# Altium footprint library mobinbyn-Capacitor.PcbLib: 152 footprints (part 7 of 10)
Each footprint in its own frame and in the unit in brackets; x right, y up, seen from the top. Pads: shape width x height; smd on the part's side, far side on the other; paste and mask are expansions set on the pad; w line width, h text height; cw(c..) or ccw(c..) is an arc to the next point about the centre after c.
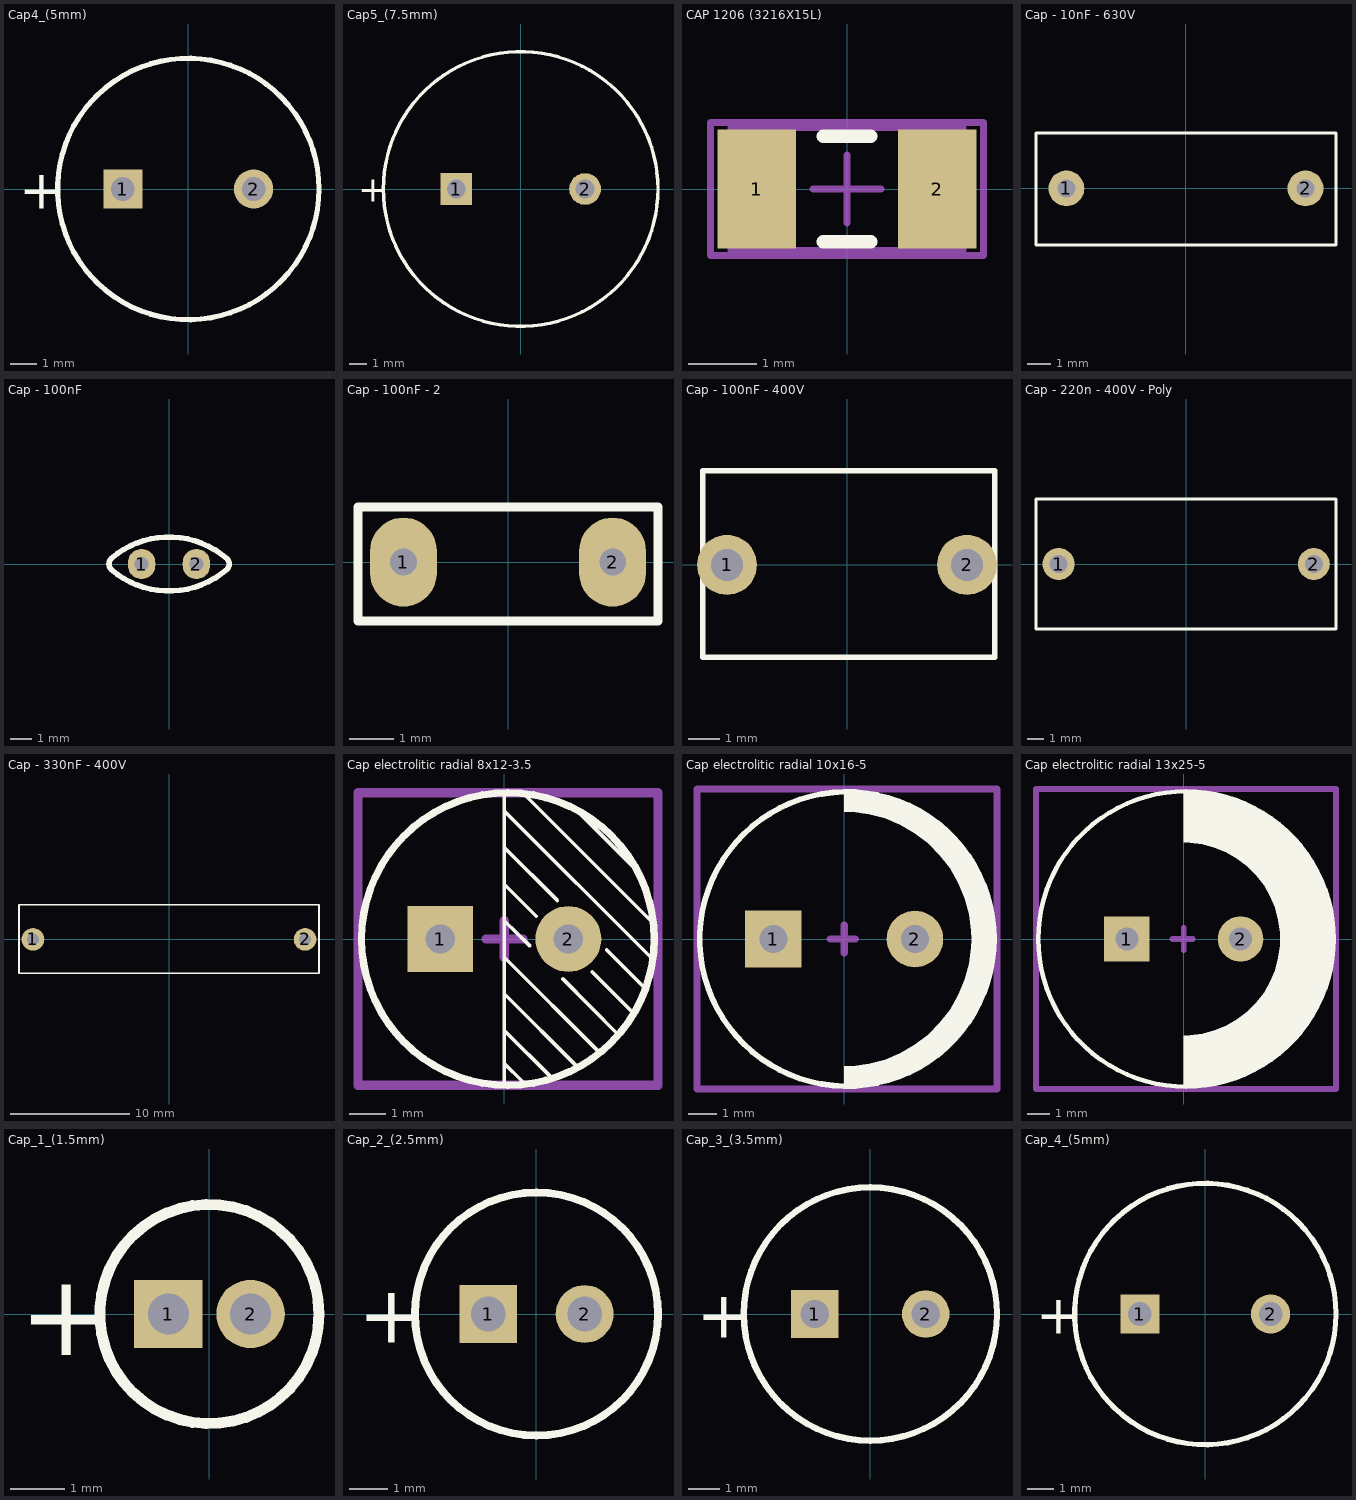
[diagram p6: the footprints below, top view; thin cyan lines are the x and y axes]

## Cap4_(5mm) [mm] "Capacitor, Electrolytic, Radial; Body 10 x 5 mm (Dia.xH typ); Pin Spacing 5 mm (typ)"
height 6
pads (2):
  rect 1.5x1.5 hole 0.9: 1(-2.5,0)
  round 1.5 hole 0.9: 2(2.5,0)
Top Overlay:
  circle w0.2: c0,0 r5
  text "+" at -6.475,-0.75 h1.5
3D body "User Library-Cap-EL(10x12-5)T.STEP": height 12.5, standoff -3.5, extent -5,-4.997 5.002,4.998

## Cap5_(7.5mm) [mm] "Capacitor, Electrolytic, Radial; Body 16 x 25 mm (Dia.xH typ); Pin Spacing 7.5 mm (typ)"
height 26
pads (2):
  rect 1.85x1.85 hole 1.1: 1(-3.75,0)
  round 1.85 hole 1.1: 2(3.75,0)
Top Overlay:
  circle w0.2: c0,0 r8
  text "+" at -9.475,-0.75 h1.5
3D body "User Library-Cap-EL(16x31_5-7_5)T.STEP": height 41, standoff -3, extent -8,-8 8.002,8

## CAP 1206 (3216X15L) [mm] "Chip Capacitor, 2-Leads, Body 3.2x1.6mm, IPC High Density"
height 1.52
pads (2):
  rect 1.15x1.75 smd: 1(-1.325,0) 2(1.325,0)
Top Overlay:
  lines w0.2: -0.35,-0.775 0.35,-0.775 ; -0.35,0.775 0.35,0.775
Mechanical 13:
  lines w0.1: -1.7,-0.9 -1.7,0.9 1.7,0.9 1.7,-0.9 -1.7,-0.9
Mechanical 15:
  lines w0.1: -0.5,0 0.5,0 ; 0,-0.5 0,0.5 ; -2,-0.975 -2,0.975 2,0.975 2,-0.975 -2,-0.975
3D body "1206 cap.STEP": height 1, standoff 0, extent -1.6,-0.8 1.6,0.8

## Cap - 10nF - 630V [mil]
pads (2):
  round 60 hole 30: 1(-200,0) 2(200,0)
Top Overlay:
  lines w5: -250.97,-94.52 251,-94.52 251,92.52 -250.97,92.52 -250.97,-94.52
3D body "Cap 10n - 630V Poly_2009.STEP": height 480, standoff -68.11, extent -250.97,-94.52 251,92.52

## Cap - 100nF [mil]
pads (2):
  oval 50x55 hole 25: 1(-50,0) 2(50,0)
Top Overlay:
  lines w10: -105.81,-9.79 ccw(c0,112.17) 106.05,-9.58 ; -105.81,9.79 cw(c0,-112.17) 106.05,9.58 ; -105.58,-9.52 cw(c-96.06,0) -105.58,9.52 ; 106,-9.52 ccw(c96.48,0) 106,9.52
3D body "Cap 100n.STEP": height 272.48, standoff -39.37, extent -115.06,-34 114.93,32.79

## Cap - 100nF - 2 [mm]
height 5
pads (2):
  oval 1.5x2 hole 0.6: 1(-2.35,0) 2(2.35,0)
Top Overlay:
  lines w0.2: -3.371,-1.328 -3.371,1.242 3.37,1.242 3.37,-1.328 -3.371,-1.328
3D body "cap.STEP": height 6.84, standoff -1.46, extent -3.1,-1.2 3.2,1.2

## Cap - 100nF - 400V [mil]
pads (2):
  round 75 hole 40: 1(-150,0) 2(150,0)
Top Overlay:
  lines w7: -180.5,-115.39 184.5,-115.39 184.5,117.65 -180.5,117.65 -180.5,-115.39
3D body "Cap 100n - 400V Poly.STEP": height 460, standoff -88.11, extent -180.5,-115.39 184.5,117.65

## Cap - 220n - 400V - Poly [mil]
pads (2):
  round 75 hole 42: 1(-300,0) 2(300,0)
Top Overlay:
  lines w7: -353,-152.52 -353,152.52 352,152.52 352,-152.52 -353,-152.52
3D body "Cap 220n - 400V Poly.STEP": height 508.74, standoff -39.37, extent -353,-152.52 352,152.52

## Cap - 330nF - 400V [mil]
pads (2):
  round 75 hole 40: 1(-450,0) 2(450,0)
Top Overlay:
  lines w5: -496.26,-112.21 495.87,-112.21 495.87,114.21 -496.26,114.21 -496.26,-112.21
3D body "Cap 330n - 400V Poly_2009.STEP": height 430, standoff -118.11, extent -468.04,-112.21 467,114.21

## Cap electrolitic radial 8x12-3.5 [mm] "Cap electrolitic radial 8x12-3.5"
height 12
pads (2):
  rect 1.8x1.8 hole 0.8: 1(-1.75,0)
  round 1.8 hole 0.8: 2(1.75,0)
Top Overlay:
  circle w0.2: c0.096,0 r4
  lines w0.1: 0,-4 0,4 ; 0,-3.4 0.5,-3.9 ; 0,-2.5 1.3,-3.8 ; 0,-1.5 2,-3.5 ; 0,-0.5 2.6,-3.1 ; 0,0.5 0.686,-0.178 ; 0,1.5 0.875,0.625 ; 0,2.5 1.45,1.05 ; 0,3.5 4,-0.5 ; 0.5,4 4,0.5 ; 1.6,-1.092 3.1,-2.6 ; 2,3.5 3.6,1.9 ; 2.4,-0.9 3.5,-2 ; 2.8,-0.3 3.8,-1.3
Mechanical 15:
  lines w0.254: -0.5,0 0.5,0 ; 0,-0.5 0,0.5 ; -4,-4 -4,4 4.2,4 4.2,-4 -4,-4
3D body "User Library-Cap-EL(8x12-3_5)T.STEP": height 12.3, standoff -3.3, extent -4,-3.998 4.002,3.998

## Cap electrolitic radial 10x16-5 [mm] "Cap electrolitic radial 10x16-5"
height 16
pads (2):
  rect 2x2 hole 1: 1(-2.5,0)
  round 2 hole 1: 2(2.5,0)
Top Overlay:
  circle w0.2: c0.096,0 r5.2
  region: 0,5.2 0.096,5.2 0.437,5.2 1.113,5.111 1.771,4.935 2.401,4.674 2.991,4.333 3.532,3.918 4.014,3.436 4.429,2.895 4.77,2.305 5.031,1.675 5.207,1.017 5.296,0.341 5.296,0 5.296,-0.341 5.207,-1.017 5.031,-1.675 4.77,-2.305 4.429,-2.895 4.014,-3.436 3.532,-3.918 2.991,-4.333 2.401,-4.674 1.771,-4.935 1.113,-5.111 0.437,-5.2 0.096,-5.2 0,-5.2 0,-4.5 0.294,-4.49 0.878,-4.414 1.446,-4.261 1.99,-4.036 2.5,-3.742 2.967,-3.383 3.383,-2.967 3.742,-2.5 4.036,-1.99 4.261,-1.446 4.414,-0.878 4.49,-0.294 4.5,0 4.49,0.294 4.414,0.878 4.261,1.446 4.036,1.99 3.742,2.5 3.383,2.967 2.967,3.383 2.5,3.742 1.99,4.036 1.446,4.261 0.878,4.414 0.294,4.49 0,4.5
Mechanical 15:
  lines w0.254: -0.5,0 0.4,0 ; 0,-0.5 0,0.5 ; -5.2,-5.3 -5.2,5.3 5.4,5.3 5.4,-5.3 -5.2,-5.3
3D body "User Library-Cap-EL(10x16-5).STEP": height 16, standoff -3.3, extent -5,-4.997 5.002,4.998

## Cap electrolitic radial 13x25-5 [mm] "Cap electrolitic radial 13x25-5"
height 25
pads (2):
  rect 2x2 hole 1: 1(-2.5,0)
  round 2 hole 1: 2(2.5,0)
Top Overlay:
  circle w0.2: c0.096,0 r6.5
  region: 0,6.5 0.096,6.5 0.415,6.5 1.051,6.437 1.677,6.313 2.288,6.127 2.878,5.883 3.442,5.582 3.973,5.227 4.466,4.822 4.918,4.37 5.323,3.877 5.678,3.346 5.979,2.782 6.223,2.192 6.409,1.581 6.533,0.955 6.596,0.319 6.596,0 6.596,-0.319 6.533,-0.955 6.409,-1.581 6.223,-2.192 5.979,-2.782 5.678,-3.346 5.323,-3.877 4.918,-4.37 4.466,-4.822 3.973,-5.227 3.442,-5.582 2.878,-5.883 2.288,-6.127 1.677,-6.313 1.051,-6.437 0.415,-6.5 0.096,-6.5 0,-6.5 0,-4.25 0.278,-4.241 0.829,-4.168 1.366,-4.024 1.88,-3.812 2.361,-3.534 2.802,-3.195 3.195,-2.802 3.534,-2.361 3.812,-1.88 4.024,-1.366 4.168,-0.829 4.241,-0.278 4.25,0 4.241,0.278 4.168,0.829 4.024,1.366 3.812,1.88 3.534,2.361 3.195,2.802 2.802,3.195 2.361,3.534 1.88,3.812 1.366,4.024 0.829,4.168 0.278,4.241 0,4.25
Mechanical 15:
  lines w0.254: -0.5,0 0.4,0 ; 0,-0.5 0,0.5 ; -6.5,-6.6 6.7,-6.6 6.7,6.6 -6.5,6.6 -6.5,-6.6
3D body "User Library-Cap-EL(13x25-5).STEP": height 25.2, standoff -3.1, extent -6.5,-6.499 6.502,6.499

## Cap_1_(1.5mm) [mm] "Capacitor, Electrolytic, Radial; Body 5 x 6.8 mm (Dia.xH typ); Pin Spacing 2 mm (typ)"
height 7.8
pads (2):
  rect 1.25x1.25 hole 0.75: 1(-0.75,0)
  round 1.25 hole 0.75: 2(0.75,0)
Top Overlay:
  circle w0.2: c0,0 r2
  text "+" at -3.475,-0.75 h1.5
3D body "User Library-Cap-EL(4x6-1_5)T.STEP": height 6.3, standoff -3.3, extent -2,-1.998 2.002,1.999

## Cap_2_(2.5mm) [mm] "Capacitor, Electrolytic, Radial; Body 6.3 x 6.8 mm (Dia.xH typ); Pin Spacing 2.5 mm (typ)"
height 7.8
pads (2):
  rect 1.5x1.5 hole 0.9: 1(-1.25,0)
  round 1.5 hole 0.9: 2(1.25,0)
Top Overlay:
  circle w0.2: c0,0 r3.15
  text "+" at -4.625,-0.75 h1.5
3D body "User Library-Cap-EL(6_3x11-2_5).STEP": height 11, standoff -3.2, extent -3.15,-3.149 3.152,3.149

## Cap_3_(3.5mm) [mm] "Capacitor, Electrolytic, Radial; Body 8 x 5 mm (Dia.xH typ); Pin Spacing 3.5 mm (typ)"
height 6
pads (2):
  rect 1.5x1.51 hole 0.9: 1(-1.75,0)
  round 1.5 hole 0.9: 2(1.75,0)
Top Overlay:
  circle w0.2: c0,0 r4
  text "+" at -5.475,-0.75 h1.5
3D body "User Library-Cap-EL(8x11-3_5).STEP": height 11, standoff -3.3, extent -4,-3.998 4.002,3.998

## Cap_4_(5mm) [mm] "Capacitor, Electrolytic, Radial; Body 10 x 5 mm (Dia.xH typ); Pin Spacing 5 mm (typ)"
height 6
pads (2):
  rect 1.5x1.5 hole 0.9: 1(-2.5,0)
  round 1.5 hole 0.9: 2(2.5,0)
Top Overlay:
  circle w0.2: c0,0 r5
  text "+" at -6.475,-0.75 h1.5
3D body "User Library-Cap-EL(10x13_5-5).STEP": height 13.5, standoff -3.3, extent -5,-4.997 5.002,4.998